# Altium footprint library laihi.PcbLib: 222 footprints (part 11 of 14)
Each footprint in its own frame and in the unit in brackets; x right, y up, seen from the top. Pads: shape width x height; smd on the part's side, far side on the other; paste and mask are expansions set on the pad; w line width, h text height; cw(c..) or ccw(c..) is an arc to the next point about the centre after c.
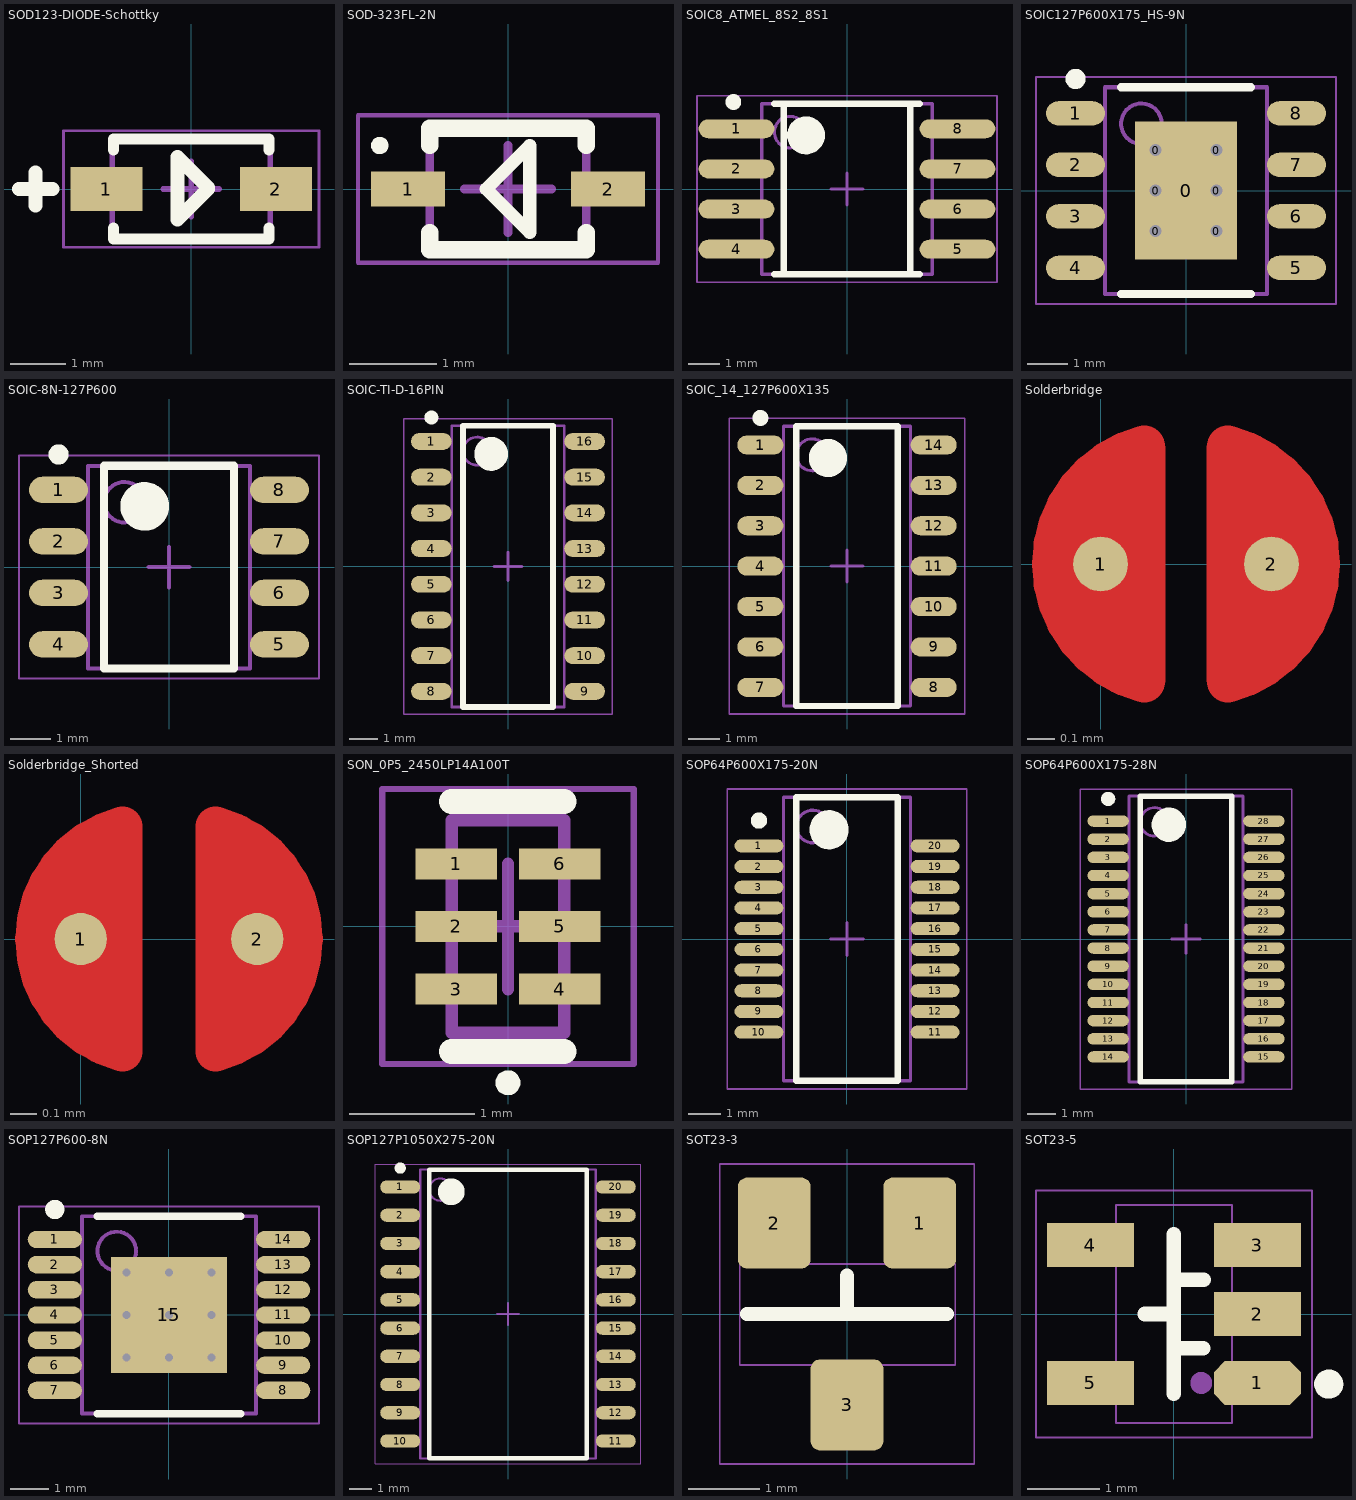
[diagram p10: the footprints below, top view; thin cyan lines are the x and y axes]

## SOD123-DIODE-Schottky [mm] "SODFL, 2-Leads, Body 1.70x3.71mm, IPC Medium Density"
height 1.35
pads (2):
  rect 1.3x0.8 smd: 1(-1.525,0) 2(1.525,0)
Top Overlay:
  lines w0.2: -1.4,-0.7 -1.4,-0.9 1.4,-0.9 1.4,-0.7 ; -1.4,0.7 -1.4,0.9 1.4,0.9 1.4,0.7
  lines w0.254: -3.1,0 -2.5,0 ; -2.8,-0.3 -2.8,0.3 ; 0.3,0 -0.25,-0.55 -0.25,0.575 0.3,0.025
Mechanical 13:
  lines w0.1: -1.42,-0.9 -1.42,0.9 1.42,0.9 1.42,-0.9 -1.42,-0.9
Mechanical 15:
  lines w0.05: -2.3,-1.05 -2.3,1.05 2.3,1.05 2.3,-1.05 -2.3,-1.05
  lines w0.1: -0.5,0 0.5,0 ; 0,-0.5 0,0.5
3D body: height 1.35, standoff 0, extent -1.42,-0.9 1.42,0.9

## SOD-323FL-2N [mm] "SODFL, 2-Leads, Body 1.25x2.55mm, IPC Medium Density"
height 0.9
pads (2):
  rect 0.85x0.4 smd: 1(-1.15,0) 2(1.15,0)
Top Overlay:
  circle w0.1: c-1.475,0.5 r0.05
  lines w0.15: -0.25,0 0.25,0.5 0.25,-0.5 -0.25,0
  lines w0.2: -0.9,-0.5 -0.9,-0.7 0.9,-0.7 0.9,-0.5 ; -0.9,0.5 -0.9,0.7 0.9,0.7 0.9,0.5
Mechanical 13:
  lines w0.1: -0.9,-0.675 -0.9,0.675 0.9,0.675 0.9,-0.675 -0.9,-0.675
Mechanical 15:
  lines w0.05: -1.725,-0.85 -1.725,0.85 1.725,0.85 1.725,-0.85 -1.725,-0.85
  lines w0.1: -0.5,0 0.5,0 ; 0,-0.5 0,0.5
3D body "SOD-323FL-2N.step": height 0.9, standoff 0, extent -1.275,-0.675 1.275,0.675

## SOIC8_ATMEL_8S2_8S1 [mm] "SOIC, 8-Leads, Body 5.25x5.30mm, Pitch 1.27mm, IPC Medium Density"
height 2.2
pads (8):
  oval 2.4x0.6 smd: 1(-3.5,1.905) 2(-3.5,0.635) 3(-3.5,-0.635) 4(-3.5,-1.905) 5(3.5,-1.905) 6(3.5,-0.635) 7(3.5,0.635) 8(3.5,1.905)
Top Overlay:
  circle w0.25: c-3.6,2.755 r0.125
  circle w0.6: c-1.3,1.7 r0.3
  lines w0.2: -2.3,-2.7 2.3,-2.7 ; -2.3,2.7 2.3,2.7 ; -2,-2.7 -2,2.7 ; 2,-2.7 2,2.7
Mechanical 13:
  circle w0.1: c-1.8,1.8 r0.5
  lines w0.1: -2.7,-2.7 -2.7,2.7 2.7,2.7 2.7,-2.7 -2.7,-2.7
Mechanical 15:
  lines w0.05: -4.75,-2.95 -4.75,2.95 4.75,2.95 4.75,-2.95 -4.75,-2.95
  lines w0.1: -0.5,0 0.5,0 ; 0,-0.5 0,0.5
3D body "SOIC8_ATMEL_8S2.step": height 2.2, standoff 0, extent -4,-2.7 4,2.7

## SOIC127P600X175_HS-9N [mm] "SOIC, 8-Leads, Body 4.90x3.90mm, Pitch 1.27mm, Thermal Pad 3.40x2.51mm, IPC Medium Density"
height 1.75
pads (15):
  round 0.352 hole 0.3: 0(-0.75,-1) 0(-0.75,0) 0(-0.75,1) 0(0.75,-1) 0(0.75,0) 0(0.75,1)
  rect 2.51x3.4 smd: 0(0,0)
  oval 1.45x0.6 smd: 1(-2.725,1.905) 2(-2.725,0.635) 3(-2.725,-0.635) 4(-2.725,-1.905) 5(2.725,-1.905) 6(2.725,-0.635) 7(2.725,0.635) 8(2.725,1.905)
Top Overlay:
  circle w0.25: c-2.725,2.755 r0.125
  lines w0.2: -1.6,-2.55 1.6,-2.55 ; -1.6,2.55 1.6,2.55
Mechanical 13:
  circle w0.1: c-1.1,1.65 r0.5
  lines w0.1: -2,-2.55 -2,2.55 2,2.55 2,-2.55 -2,-2.55
Mechanical 15:
  lines w0.05: -3.7,-2.8 -3.7,2.8 3.7,2.8 3.7,-2.8 -3.7,-2.8
  lines w0.1: -0.5,0 0.5,0 ; 0,-0.5 0,0.5
3D body "SOIC127P600X175_HS-9N.step": height 1.75, standoff 0, extent -3,-2.55 3,2.55

## SOIC-8N-127P600 [mm] "SOIC Atmel 8S1 8pin 4mm by 5mm"
height 1.75
pads (8):
  oval 1.45x0.65 smd: 1(-2.725,1.905) 2(-2.725,0.635) 3(-2.725,-0.635) 4(-2.725,-1.905) 5(2.725,-1.905) 6(2.725,-0.635) 7(2.725,0.635) 8(2.725,1.905)
Top Overlay:
  circle w0.6: c-0.6,1.5 r0.3
  circle w0.25: c-2.725,2.78 r0.125
  lines w0.2: -1.6,-2.5 1.6,-2.5 1.6,2.5 -1.6,2.5 -1.6,-2.5
Mechanical 13:
  circle w0.1: c-1.1,1.6 r0.5
  lines w0.1: -2,-2.5 2,-2.5 2,2.5 -2,2.5 -2,-2.5
Mechanical 15:
  lines w0.05: -3.7,-2.75 3.7,-2.75 3.7,2.75 -3.7,2.75 -3.7,-2.75
  lines w0.1: -0.5,0 0.5,0 ; 0,-0.5 0,0.5
3D body "SOIC-8N-127P600.step": height 1.98, standoff 0.25, extent -2.848,-2.5 2.848,2.5

## SOIC-TI-D-16PIN [mm] "SOIC, 16-Leads, Body 9.90x3.90mm, Pitch 1.27mm, IPC Medium Density"
height 1.75
pads (16):
  oval 1.45x0.6 smd: 1(-2.725,4.445) 2(-2.725,3.175) 3(-2.725,1.905) 4(-2.725,0.635) 5(-2.725,-0.635) 6(-2.725,-1.905) 7(-2.725,-3.175) 8(-2.725,-4.445) 9(2.725,-4.445) 10(2.725,-3.175) 11(2.725,-1.905) 12(2.725,-0.635) 13(2.725,0.635) 14(2.725,1.905) 15(2.725,3.175) 16(2.725,4.445)
Top Overlay:
  circle w0.6: c-0.6,4 r0.3
  circle w0.25: c-2.725,5.295 r0.125
  lines w0.2: -1.6,-5 1.6,-5 1.6,5 -1.6,5 -1.6,-5
Mechanical 13:
  circle w0.1: c-1.1,4.1 r0.5
  lines w0.1: -2,-5 2,-5 2,5 -2,5 -2,-5
Mechanical 15:
  lines w0.05: -3.7,-5.25 3.7,-5.25 3.7,5.25 -3.7,5.25 -3.7,-5.25
  lines w0.1: -0.5,0 0.5,0 ; 0,-0.5 0,0.5
3D body: height 1.75, standoff 0.1, extent -2,-5 2,5

## SOIC_14_127P600X135 [mm] "SOIC, 14-Leads, Body 8.65x3.90mm, Pitch 1.27mm, IPC Medium Density"
height 1.35
pads (14):
  oval 1.45x0.6 smd: 1(-2.725,3.81) 2(-2.725,2.54) 3(-2.725,1.27) 4(-2.725,0) 5(-2.725,-1.27) 6(-2.725,-2.54) 7(-2.725,-3.81) 8(2.725,-3.81) 9(2.725,-2.54) 10(2.725,-1.27) 11(2.725,0) 12(2.725,1.27) 13(2.725,2.54) 14(2.725,3.81)
Top Overlay:
  circle w0.25: c-2.725,4.66 r0.125
  circle w0.6: c-0.6,3.4 r0.3
  lines w0.2: -1.6,-4.4 -1.6,4.4 1.6,4.4 1.6,-4.4 -1.6,-4.4
Mechanical 13:
  circle w0.1: c-1.1,3.5 r0.5
  lines w0.1: -2,-4.4 -2,4.4 2,4.4 2,-4.4 -2,-4.4
Mechanical 15:
  lines w0.05: -3.7,-4.65 -3.7,4.65 3.7,4.65 3.7,-4.65 -3.7,-4.65
  lines w0.1: -0.5,0 0.5,0 ; 0,-0.5 0,0.5
3D body "SOIC_14_127P600X135.step": height 1.75, standoff 0, extent -3,-4.4 3,4.4

## Solderbridge [mm]
pads (2):
  round 0.2 smd paste-10: 1(0,0) 2(0.625,0)
Top Layer:
  region: 0.389,0.432 0.465,0.505 0.583,0.467 0.648,0.424 0.721,0.351 0.775,0.292 0.833,0.193 0.861,0.099 0.856,-0.122 0.831,-0.193 0.747,-0.33 0.663,-0.411 0.571,-0.469 0.47,-0.5 0.419,-0.483 0.389,-0.43
  region: 0.236,-0.432 0.16,-0.505 0.042,-0.467 -0.023,-0.424 -0.097,-0.351 -0.15,-0.292 -0.208,-0.193 -0.236,-0.099 -0.231,0.122 -0.206,0.193 -0.122,0.33 -0.038,0.411 0.054,0.469 0.155,0.5 0.206,0.483 0.236,0.43
  lines w0.152: 0.159,-0.431 cw(c0.27,0) 0.159,0.431 ; 0.465,-0.431 ccw(c0.355,0) 0.465,0.431
Top Solder:
  circle w0.61: c0.31,0 r0.279

## Solderbridge_Shorted [mm]
pads (2):
  round 0.2 smd paste-10: 1(0,0) 2(0.676,0)
Top Layer:
  region: 0.236,-0.432 0.16,-0.505 0.042,-0.467 -0.023,-0.424 -0.097,-0.351 -0.15,-0.292 -0.208,-0.193 -0.236,-0.099 -0.231,0.122 -0.206,0.193 -0.122,0.33 -0.038,0.411 0.054,0.469 0.155,0.5 0.206,0.483 0.236,0.43
  region: 0.44,0.432 0.516,0.505 0.634,0.467 0.699,0.424 0.772,0.351 0.826,0.292 0.884,0.193 0.912,0.099 0.907,-0.122 0.881,-0.193 0.798,-0.33 0.714,-0.411 0.622,-0.469 0.521,-0.5 0.47,-0.483 0.44,-0.43
  lines w0.152: 0.159,-0.431 cw(c0.27,0) 0.159,0.431 ; 0.516,-0.431 ccw(c0.406,0) 0.516,0.431
Top Paste:
  circle w0.61: c0.338,0 r0.169
Top Solder:
  circle w0.61: c0.31,0 r0.279
  circle w0.61: c0.366,0 r0.279

## SON_0P5_2450LP14A100T [mm] "SON, 6-Leads, Body 1.60x0.80mm, Pitch 0.50mm, 2450LP14A100T 2.45G Low Pass Filter"
height 0.7
pads (6):
  rect 0.65x0.25 smd: 1(-0.415,0.5) 2(-0.415,0) 3(-0.415,-0.5) 4(0.415,-0.5) 5(0.415,0) 6(0.415,0.5)
Top Overlay:
  circle w0.1: c0,-1.25 r0.05
  lines w0.2: -0.45,-1 0.45,-1 ; -0.45,1 0.45,1
Mechanical 13:
  lines w0.1: -0.45,-0.85 -0.45,0.85 0.45,0.85 0.45,-0.85 -0.45,-0.85
Mechanical 15:
  lines w0.05: -1.005,-1.1 -1.005,1.1 1.005,1.1 1.005,-1.1 -1.005,-1.1
  lines w0.1: -0.5,0 0.5,0 ; 0,-0.5 0,0.5
3D body "SON_0P5_2450LP14A100T.step": height 0.7, standoff 0.1, extent -0.45,-0.85 0.45,0.85

## SOP64P600X175-20N [mm] "SOP, 20-Leads, Body 8.66x3.90mm, Pitch 0.64mm, IPC Medium Density"
height 1.75
pads (20):
  oval 1.5x0.4 smd mask+0.076: 1(-2.7,2.857) 2(-2.7,2.222) 3(-2.7,1.587) 4(-2.7,0.953) 5(-2.7,0.318) 6(-2.7,-0.318) 7(-2.7,-0.953) 8(-2.7,-1.587) 9(-2.7,-2.222) 10(-2.7,-2.857) 11(2.7,-2.857) 12(2.7,-2.222) 13(2.7,-1.587) 14(2.7,-0.953) 15(2.7,-0.318) 16(2.7,0.318) 17(2.7,0.953) 18(2.7,1.587) 19(2.7,2.222) 20(2.7,2.857)
Top Overlay:
  circle w0.25: c-2.7,3.632 r0.125
  circle w0.6: c-0.55,3.35 r0.3
  lines w0.2: -1.55,-4.35 -1.55,4.35 1.55,4.35 1.55,-4.35 -1.55,-4.35
Mechanical 13:
  circle w0.1: c-1.05,3.45 r0.5
  lines w0.1: -1.95,-4.35 -1.95,4.35 1.95,4.35 1.95,-4.35 -1.95,-4.35
Mechanical 15:
  lines w0.05: -3.675,-4.6 -3.675,4.6 3.675,4.6 3.675,-4.6 -3.675,-4.6
  lines w0.1: -0.5,0 0.5,0 ; 0,-0.5 0,0.5
3D body "SOP64P600X175-20N.step": height 1.75, standoff 0, extent -3,-4.35 3,4.35

## SOP64P600X175-28N [mm] "SOP, 28-Leads, Body 9.90x3.93mm, Pitch 0.64mm, IPC Medium Density"
height 1.75
pads (28):
  oval 1.45x0.4 smd mask+0.076: 1(-2.725,4.127) 2(-2.725,3.492) 3(-2.725,2.857) 4(-2.725,2.222) 5(-2.725,1.587) 6(-2.725,0.953) 7(-2.725,0.318) 8(-2.725,-0.318) 9(-2.725,-0.953) 10(-2.725,-1.587) 11(-2.725,-2.222) 12(-2.725,-2.857) 13(-2.725,-3.492) 14(-2.725,-4.127) 15(2.725,-4.127) 16(2.725,-3.492) 17(2.725,-2.857) 18(2.725,-2.222) 19(2.725,-1.587) 20(2.725,-0.953) 21(2.725,-0.318) 22(2.725,0.318) 23(2.725,0.953) 24(2.725,1.587) 25(2.725,2.222) 26(2.725,2.857) 27(2.725,3.492) 28(2.725,4.127)
Top Overlay:
  circle w0.25: c-2.725,4.902 r0.125
  circle w0.6: c-0.6,4 r0.3
  lines w0.2: -1.6,-5 -1.6,5 1.6,5 1.6,-5 -1.6,-5
Mechanical 13:
  circle w0.1: c-1.1,4.1 r0.5
  lines w0.1: -2,-5 -2,5 2,5 2,-5 -2,-5
Mechanical 15:
  lines w0.05: -3.7,-5.25 -3.7,5.25 3.7,5.25 3.7,-5.25 -3.7,-5.25
  lines w0.1: -0.5,0 0.5,0 ; 0,-0.5 0,0.5
3D body "SOP64P600X175-28N.step": height 1.75, standoff 0, extent -3,-5 3,5

## SOP127P600-8N [mm] "14-Lead Exposed Pad Plastic TSSOP Package"
height 1.1
pads (15):
  oval 1.4x0.45 smd: 1(-2.95,1.95) 2(-2.95,1.3) 3(-2.95,0.65) 4(-2.95,0) 5(-2.95,-0.65) 6(-2.95,-1.3) 7(-2.95,-1.95) 8(2.95,-1.95) 9(2.95,-1.3) 10(2.95,-0.65) 11(2.95,0) 12(2.95,0.65) 13(2.95,1.3) 14(2.95,1.95)
  rect 3x3 smd: 15(0,0)
via -1.1,1.1 diameter 0.5 hole 0.2
via 0,1.1 diameter 0.5 hole 0.2
via 1.1,1.1 diameter 0.5 hole 0.2
via -1.1,0 diameter 0.5 hole 0.2
via 0,0 diameter 0.5 hole 0.2
via 1.1,0 diameter 0.5 hole 0.2
via -1.1,-1.1 diameter 0.5 hole 0.2
via 0,-1.1 diameter 0.5 hole 0.2
via 1.1,-1.1 diameter 0.5 hole 0.2
Top Overlay:
  circle w0.25: c-2.95,2.725 r0.125
  lines w0.2: -1.85,-2.55 1.85,-2.55 ; -1.85,2.55 1.85,2.55
Mechanical 13:
  circle w0.1: c-1.35,1.65 r0.5
  lines w0.1: -2.25,-2.55 -2.25,2.55 2.25,2.55 2.25,-2.55 -2.25,-2.55
Mechanical 15:
  lines w0.05: -3.875,-2.8 -3.875,2.8 3.875,2.8 3.875,-2.8 -3.875,-2.8
  lines w0.1: -0.5,0 0.5,0 ; 0,-0.5 0,0.5
3D body: height 1.1, standoff 0.1, extent -2.25,-2.55 2.25,2.55

## SOP127P1050X275-20N [mm] "SOP, 20-Leads, Body 12.70x7.65mm, Pitch 1.27mm, IPC Medium Density"
height 2.75
pads (20):
  oval 1.8x0.6 smd: 1(-4.85,5.715) 2(-4.85,4.445) 3(-4.85,3.175) 4(-4.85,1.905) 5(-4.85,0.635) 6(-4.85,-0.635) 7(-4.85,-1.905) 8(-4.85,-3.175) 9(-4.85,-4.445) 10(-4.85,-5.715) 11(4.85,-5.715) 12(4.85,-4.445) 13(4.85,-3.175) 14(4.85,-1.905) 15(4.85,-0.635) 16(4.85,0.635) 17(4.85,1.905) 18(4.85,3.175) 19(4.85,4.445) 20(4.85,5.715)
Top Overlay:
  circle w0.6: c-2.55,5.5 r0.3
  circle w0.25: c-4.85,6.565 r0.125
  lines w0.2: -3.55,-6.5 3.55,-6.5 3.55,6.5 -3.55,6.5 -3.55,-6.5
Mechanical 13:
  circle w0.1: c-3.05,5.6 r0.5
  lines w0.1: -3.95,-6.5 3.95,-6.5 3.95,6.5 -3.95,6.5 -3.95,-6.5
Mechanical 15:
  lines w0.05: -5.975,-6.75 5.975,-6.75 5.975,6.75 -5.975,6.75 -5.975,-6.75
  lines w0.1: -0.5,0 0.5,0 ; 0,-0.5 0,0.5
3D body: height 2.75, standoff 0.05, extent -3.95,-6.5 3.95,6.5

## SOT23-3 [mil] "STX"
pads (3):
  rrect25% 40x50 smd: 1(40,50) 2(-40,50) 3(0,-50)
Top Overlay:
  lines w7.87: -55,0 55,0 ; 0,1 0,21
Mechanical 13:
  lines w1: -49.95,27.5 -49.95,50.5 -28.95,50.5 -28.95,27.5 ; -10,-28.5 -10,-51.5 10,-51.5 10,-28.5 ; 29.95,27.5 29.95,50.5 49.95,50.5 49.95,27.5 ; 59,27.5 -59,27.5 -59,-28 59.5,-28 59.5,27.5
Mechanical 15:
  lines w0.98: -70,-82.48 -70,82.48 70,82.48 70,-82.48 -70,-82.48
3D body "sot23-3.stp": height 40.16, standoff -3.94, extent -59.84,-50 59.84,53.93

## SOT23-5 [mm]
pads (5):
  oct 1.2x0.6 smd: 1(1.15,-0.95)
  rect 1.2x0.6 smd: 2(1.15,0) 3(1.15,0.95) 4(-1.15,0.95) 5(-1.15,-0.95)
Top Overlay:
  circle w0.2: c2.132,-0.965 r0.1
  lines w0.2: -0.4,0 0,0 ; 0,-1.1 0,1.1 ; 0,-0.47 0.406,-0.47 ; 0,0.47 0.413,0.47
Mechanical 13:
  circle w0.15: c0.376,-0.95 r0.076
  lines w0.025: -1.016,-1.1 -1.016,-0.8 ; -1.016,0.8 -1.016,1.1 ; -0.8,-1.1 -1.4,-1.1 -1.4,-0.8 -0.8,-0.8 ; -0.8,0.8 -1.4,0.8 -1.4,1.1 -0.8,1.1 ; 0.8,-1.1 1.4,-1.1 1.4,-0.8 0.8,-0.8 ; 0.8,-0.15 1.4,-0.15 1.4,0.15 0.8,0.15 ; 0.8,0.8 1.4,0.8 1.4,1.1 0.8,1.1 ; 1.016,-1.1 1.016,-0.8 ; 1.016,-0.15 1.016,0.15 ; 1.016,0.8 1.016,1.1 ; -0.8,-1.5 0.8,-1.5 0.8,1.5 -0.8,1.5 -0.8,-1.5
Mechanical 15:
  lines w0.025: -1.9,-1.7 1.9,-1.7 1.9,1.7 -1.9,1.7 -1.9,-1.7
3D body "SOT23-5.stp": height 1.4, standoff 0, extent -1.5,-1.525 1.5,1.525